# Altium footprint library connectors_USB_ETH.PcbLib: 71 footprints (part 4 of 5)
Each footprint in its own frame and in the unit in brackets; x right, y up, seen from the top. Pads: shape width x height; smd on the part's side, far side on the other; paste and mask are expansions set on the pad; w line width, h text height; cw(c..) or ccw(c..) is an arc to the next point about the centre after c.
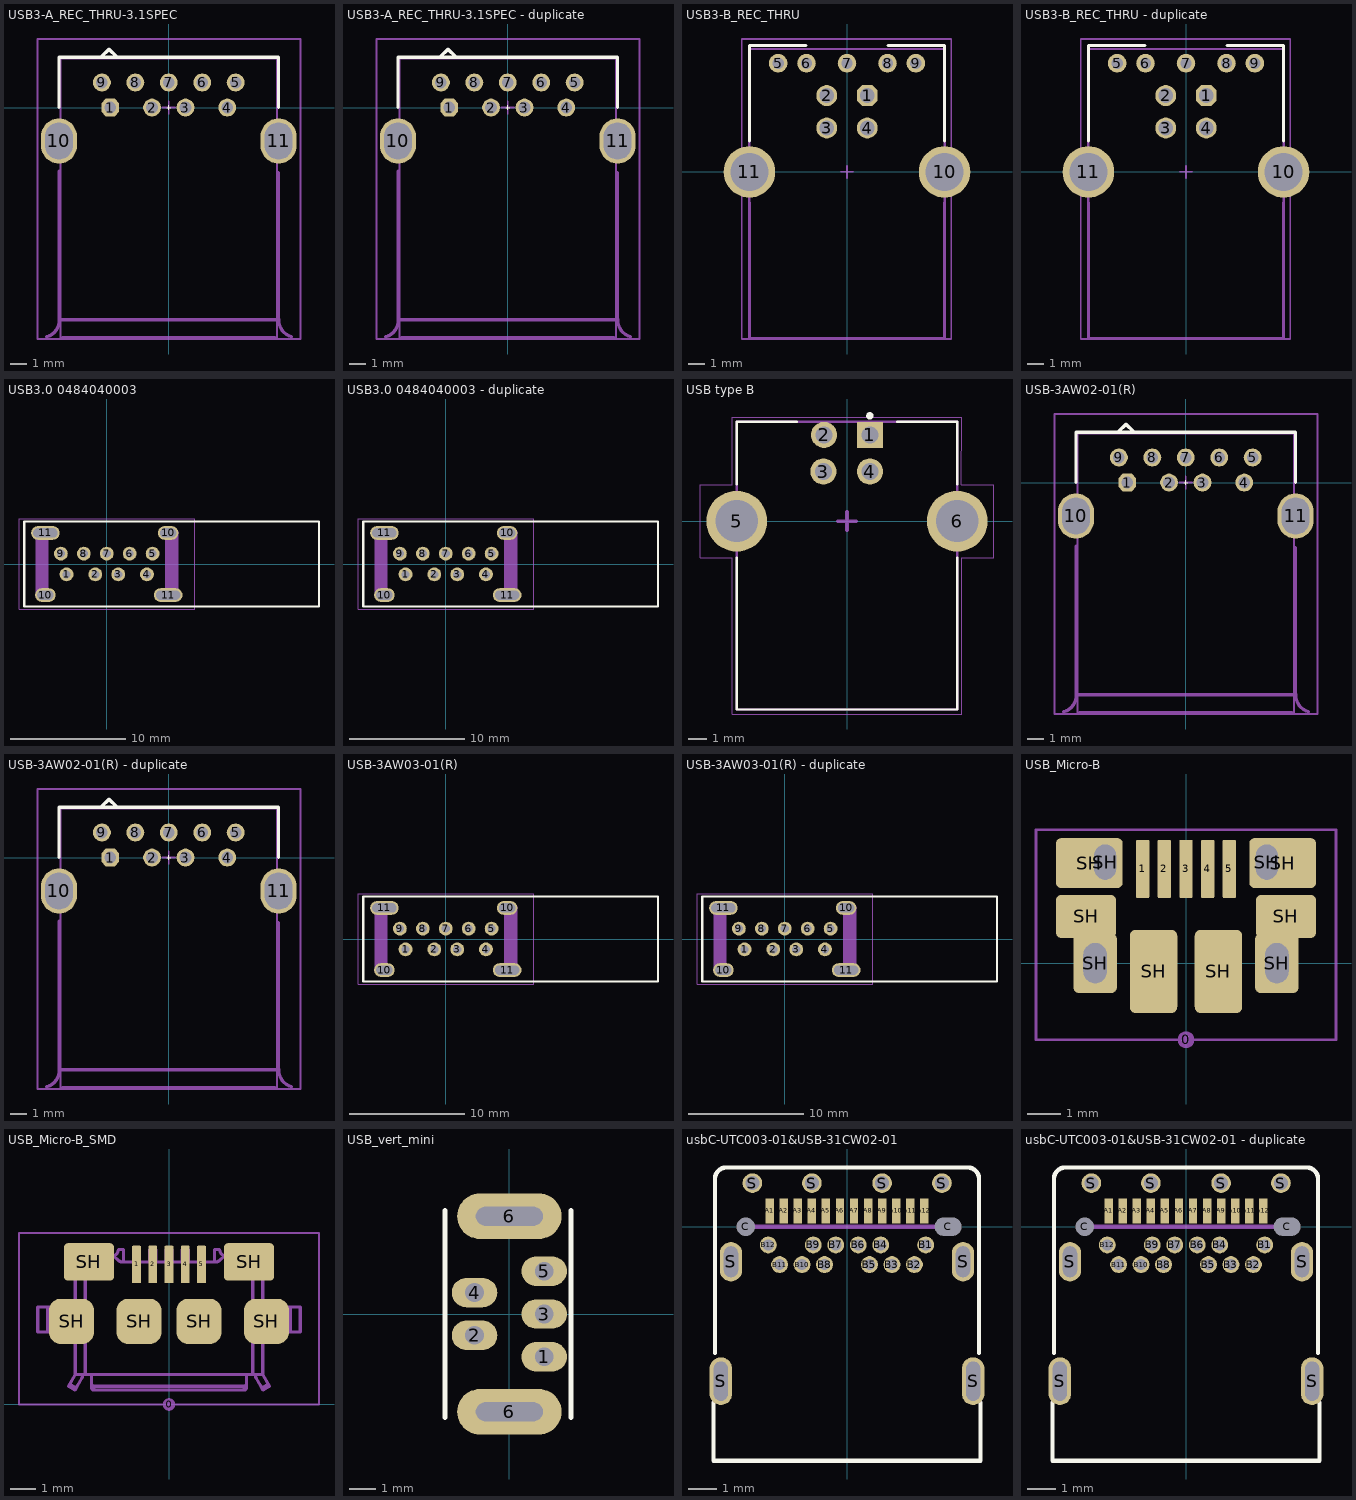
[diagram p3: the footprints below, top view; thin cyan lines are the x and y axes]

## USB3-A_REC_THRU-3.1SPEC [mm] "RECEPTACLE USB3 TYPE A TH 3.1 SPEC SUGGESTED FOOTPRINT AMPHENOL GSB311131HR"
height 7.493
pads (11):
  oct 1.07x1.07 hole 0.7: 1(-3.5,0)
  round 1.07 hole 0.7: 2(-1,0) 3(1,0) 4(3.5,0) 5(4,1.5) 6(2,1.5) 7(0,1.5) 8(-2,1.5) 9(-4,1.5)
  oval 2.159x2.705 hole 1.651 slot 2.197 at 90 deg: 10(-6.57,-2) 11(6.57,-2)
Top Layer:
  rectangle: -7.391,-2.273 -5.74,-1.727
Top Overlay:
  lines w0.025: -0.127,0 0,0 ; 0,-0.127 0,0 ; 0,0.127 0,0 ; 0.127,0 0,0
  lines w0.203: -6.565,0 -6.565,3 6.565,3 6.565,0 ; -4.037,3.037 -3.574,3.5 -3.087,3.013
M11_dimension:
  lines w0.1: -6.477,-13.843 -6.477,2.921 6.477,2.921 6.477,-13.843 -6.477,-13.843
  lines w0.203: -7.304,-13.718 ccw(c-7.589,-12.71) -6.541,-12.677 ; -6.565,-3.8 -6.565,-12.7 6.565,-12.7 6.565,-3.9 ; -6.35,-13.78 6.35,-13.78 ; 6.569,-12.658 ccw(c7.616,-12.691) 7.331,-13.7
  text ".Designator" at -3.725,-3.975 h0.8
  text "1" at -4.5,-0.9 h1.52
Mechanical 13:
  lines w0.1: -6.477,-13.843 -6.477,2.921 6.477,2.921 6.477,-13.843 -6.477,-13.843
Mechanical 15:
  lines w0.1: -0.381,0 0.381,0 ; 0,-0.381 0,0.381 ; -7.85,-13.843 7.875,-13.843 7.875,4.1 -7.85,4.1 -7.85,-13.843
3D body "USB3-A.stp": height 8, standoff -3.22, extent -7.74,-13.777 7.74,2.703

## USB3-A_REC_THRU-3.1SPEC - duplicate [mm] "RECEPTACLE USB3 TYPE A TH 3.1 SPEC SUGGESTED FOOTPRINT AMPHENOL GSB311131HR"
height 7.493
pads (11):
  oct 1.07x1.07 hole 0.7: 1(-3.5,0)
  round 1.07 hole 0.7: 2(-1,0) 3(1,0) 4(3.5,0) 5(4,1.5) 6(2,1.5) 7(0,1.5) 8(-2,1.5) 9(-4,1.5)
  oval 2.159x2.705 hole 1.651 slot 2.197 at 90 deg: 10(-6.57,-2) 11(6.57,-2)
Top Layer:
  rectangle: -7.391,-2.273 -5.74,-1.727
Top Overlay:
  lines w0.025: -0.127,0 0,0 ; 0,-0.127 0,0 ; 0,0.127 0,0 ; 0.127,0 0,0
  lines w0.203: -6.565,0 -6.565,3 6.565,3 6.565,0 ; -4.037,3.037 -3.574,3.5 -3.087,3.013
M11_dimension:
  lines w0.1: -6.477,-13.843 6.477,-13.843 6.477,2.921 -6.477,2.921 -6.477,-13.843
  lines w0.203: -7.304,-13.718 ccw(c-7.589,-12.71) -6.541,-12.677 ; -6.565,-3.8 -6.565,-12.7 6.565,-12.7 6.565,-3.9 ; -6.35,-13.78 6.35,-13.78 ; 6.569,-12.658 ccw(c7.616,-12.691) 7.331,-13.7
  text "1" at -4.5,-0.9 h1.52
  text ".Designator" at -3.725,-3.975 h0.8
Mechanical 13:
  lines w0.1: -6.477,-13.843 6.477,-13.843 6.477,2.921 -6.477,2.921 -6.477,-13.843
Mechanical 15:
  lines w0.1: -0.381,0 0.381,0 ; 0,-0.381 0,0.381 ; -7.85,-13.843 -7.85,4.1 7.875,4.1 7.875,-13.843 -7.85,-13.843
3D body "USB3-A.stp": height 8, standoff -3.22, extent -7.74,-13.777 7.74,2.703

## USB3-B_REC_THRU [mm]
pads (11):
  oct 1.295x1.295 hole 0.914: 1(1.25,4.71)
  round 1.295 hole 0.914: 2(-1.25,4.71) 3(-1.25,2.71) 4(1.25,2.71)
  round 1.15 hole 0.7: 5(-4.25,6.71) 6(-2.5,6.71) 7(0,6.71) 8(2.5,6.71) 9(4.25,6.71)
  round 3.175 hole 2.362: 10(6.02,0) 11(-6.02,0)
Top Overlay:
  lines w0.203: -6.02,1.905 -6.02,7.8 -2.54,7.8 ; 2.54,7.8 6.02,7.8 6.02,1.905
M11_dimension:
  lines w0.1: -6.071,-10.287 6.045,-10.287 6.045,7.569 -6.071,7.569 -6.071,-10.287
Mechanical 13:
  lines w0.1: -5.994,-10.262 6.02,-10.262 6.02,7.595 -5.994,7.595 -5.994,-10.262
Mechanical 15:
  lines w0.1: -0.381,0 0.381,0 ; 0,-0.381 0,0.381 ; -6.502,-10.312 -6.502,8.204 6.426,8.204 6.426,-10.312 -6.502,-10.312
Mechanical 16:
  lines w0.203: -6.02,-1.905 -6.02,-10.28 6.02,-10.28 6.02,-1.905
3D body "USB3-B.stp": height 12.93, standoff -3.2, extent -7.2,-10.324 7.2,7.976

## USB3-B_REC_THRU - duplicate [mm]
pads (11):
  oct 1.295x1.295 hole 0.914: 1(1.25,4.71)
  round 1.295 hole 0.914: 2(-1.25,4.71) 3(-1.25,2.71) 4(1.25,2.71)
  round 1.15 hole 0.7: 5(-4.25,6.71) 6(-2.5,6.71) 7(0,6.71) 8(2.5,6.71) 9(4.25,6.71)
  round 3.175 hole 2.362: 10(6.02,0) 11(-6.02,0)
Top Overlay:
  lines w0.203: -6.02,1.905 -6.02,7.8 -2.54,7.8 ; 2.54,7.8 6.02,7.8 6.02,1.905
M11_dimension:
  lines w0.1: -6.071,-10.287 -6.071,7.569 6.045,7.569 6.045,-10.287 -6.071,-10.287
Mechanical 13:
  lines w0.1: -5.994,-10.262 -5.994,7.595 6.02,7.595 6.02,-10.262 -5.994,-10.262
Mechanical 15:
  lines w0.1: -0.381,0 0.381,0 ; 0,-0.381 0,0.381 ; -6.502,-10.312 6.426,-10.312 6.426,8.204 -6.502,8.204 -6.502,-10.312
Mechanical 16:
  lines w0.203: -6.02,-1.905 -6.02,-10.28 6.02,-10.28 6.02,-1.905
3D body "USB3-B.stp": height 12.93, standoff -3.2, extent -7.2,-10.324 7.2,7.976

## USB3.0 0484040003 [mm] "0484040003"
pads (13):
  round 1.208 hole 0.7: 1(-3.5,-0.9) 2(-1,-0.9) 3(1,-0.9) 4(3.5,-0.9) 5(4,0.9) 6(2,0.9) 7(0,0.9) 8(-2,0.9) 9(-4,0.9)
  oval 1.8x1.2 hole 0.8 slot 1.4 at 0 deg: 10(-5.35,-2.71) 10(5.35,2.71)
  oval 2.5x1.2 hole 0.8 slot 2.1 at 0 deg: 11(-5.35,2.71) 11(5.35,-2.71)
Top Overlay:
  lines w0.2: -7.2,-3.7 -7.2,3.7 18.5,3.7 18.5,-3.7 -7.2,-3.7
M1_3D_TOP:
  region: 6.215,-2.84 5.1,-2.84 5.1,2.847 6.215,2.847
  region: -5.111,-2.84 -6.2,-2.84 -6.2,2.846 -5.111,2.846
  lines w0.05: -7.65,-3.95 7.65,-3.95 7.65,3.95 -7.65,3.95 -7.65,-3.95
3D body "484040003.stp": height 14.6, standoff -3.61, extent -7.15,-3.67 18.55,3.65

## USB3.0 0484040003 - duplicate [mm] "0484040003"
pads (13):
  round 1.208 hole 0.7: 1(-3.5,-0.9) 2(-1,-0.9) 3(1,-0.9) 4(3.5,-0.9) 5(4,0.9) 6(2,0.9) 7(0,0.9) 8(-2,0.9) 9(-4,0.9)
  oval 1.8x1.2 hole 0.8 slot 1.4 at 0 deg: 10(-5.35,-2.71) 10(5.35,2.71)
  oval 2.5x1.2 hole 0.8 slot 2.1 at 0 deg: 11(-5.35,2.71) 11(5.35,-2.71)
Top Overlay:
  lines w0.2: -7.2,-3.7 -7.2,3.7 18.5,3.7 18.5,-3.7 -7.2,-3.7
M1_3D_TOP:
  region: 6.215,-2.84 5.1,-2.84 5.1,2.847 6.215,2.847
  region: -5.111,-2.84 -6.2,-2.84 -6.2,2.846 -5.111,2.846
  lines w0.05: -7.65,-3.95 7.65,-3.95 7.65,3.95 -7.65,3.95 -7.65,-3.95
3D body "484040003.stp": height 14.6, standoff -3.61, extent -7.15,-3.67 18.55,3.65

## USB type B [mm] "TE_292304-5"
pads (6):
  rect 1.428x1.428 hole 0.92: 1(1.25,4.71)
  round 1.428 hole 0.92: 2(-1.25,4.71) 3(-1.29,2.71) 4(1.25,2.71)
  round 3.316 hole 2.3: 5(-6.02,0) 6(6.02,0)
Top Overlay:
  circle w0.2: c1.25,5.75 r0.1
  lines w0.127: -6.02,-2 -6.02,-10.28 6.02,-10.28 6.02,-2 ; -6.02,2 -6.02,5.43 ; -6,5.43 -2.75,5.43 ; 2.75,5.43 6.02,5.43 6.02,2
M3_comm_top:
  text ".comment" at -0.9,-0.3 h1
M5_asm_top:
  lines w0.127: -6.02,-10.28 6.02,-10.28 ; -6.02,-10.28 -6.02,5.43 ; -6.02,-10.28 6.02,-10.28 ; -6.02,-10.28 -6.02,5.43 ; -6.02,5.43 6.02,5.43 ; -6.02,5.43 6.02,5.43 ; 6.02,-10.28 6.02,5.43 ; 6.02,-10.28 6.02,5.43
  text ".Designator" at -1,1.3 h1
M7_courtyard_top:
  lines w0.05: -8,-2 -8,2 -6.27,2 -6.27,5.68 6.27,5.68 6.25,2 8,2 8,-2 6.27,-2 6.27,-10.53 -6.27,-10.53 -6.27,-2 -8,-2
  lines w0.2: -0.5,0 0.5,0 ; 0,-0.5 0,0.5
3D body "c-292304-5-d-3d.stp": height 11.55, standoff -3.87, extent -7.195,-10.25 7.195,5.45

## USB-3AW02-01(R) [mm] "USB-3AW02-01(R)"
height 7.493
pads (11):
  oct 1.07x1.07 hole 0.7: 1(-3.5,0)
  round 1.07 hole 0.7: 2(-1,0) 3(1,0) 4(3.5,0) 5(4,1.5) 6(2,1.5) 7(0,1.5) 8(-2,1.5) 9(-4,1.5)
  oval 2.159x2.705 hole 1.651 slot 2.197 at 90 deg: 10(-6.57,-2) 11(6.57,-2)
Top Layer:
  rectangle: -7.391,-2.273 -5.74,-1.727
Top Overlay:
  lines w0.025: -0.127,0 0,0 ; 0,-0.127 0,0 ; 0,0.127 0,0 ; 0.127,0 0,0
  lines w0.203: -6.565,0 -6.565,3 6.565,3 6.565,0 ; -4.037,3.037 -3.574,3.5 -3.087,3.013
M11_dimension:
  lines w0.1: -6.477,-13.843 -6.477,2.921 6.477,2.921 6.477,-13.843 -6.477,-13.843
  lines w0.203: -7.304,-13.718 ccw(c-7.589,-12.71) -6.541,-12.677 ; -6.565,-3.8 -6.565,-12.7 6.565,-12.7 6.565,-3.9 ; -6.35,-13.78 6.35,-13.78 ; 6.569,-12.658 ccw(c7.616,-12.691) 7.331,-13.7
  text ".Designator" at -3.725,-3.975 h0.8
  text "1" at -4.5,-0.9 h1.52
Mechanical 13:
  lines w0.1: -6.477,-13.843 -6.477,2.921 6.477,2.921 6.477,-13.843 -6.477,-13.843
Mechanical 15:
  lines w0.1: -0.381,0 0.381,0 ; 0,-0.381 0,0.381 ; -7.85,-13.843 7.875,-13.843 7.875,4.1 -7.85,4.1 -7.85,-13.843
3D body "USB3-A.stp": height 8, standoff -3.22, extent -7.74,-13.777 7.74,2.703

## USB-3AW02-01(R) - duplicate [mm] "USB-3AW02-01(R)"
height 7.493
pads (11):
  oct 1.07x1.07 hole 0.7: 1(-3.5,0)
  round 1.07 hole 0.7: 2(-1,0) 3(1,0) 4(3.5,0) 5(4,1.5) 6(2,1.5) 7(0,1.5) 8(-2,1.5) 9(-4,1.5)
  oval 2.159x2.705 hole 1.651 slot 2.197 at 90 deg: 10(-6.57,-2) 11(6.57,-2)
Top Layer:
  rectangle: -7.391,-2.273 -5.74,-1.727
Top Overlay:
  lines w0.025: -0.127,0 0,0 ; 0,-0.127 0,0 ; 0,0.127 0,0 ; 0.127,0 0,0
  lines w0.203: -6.565,0 -6.565,3 6.565,3 6.565,0 ; -4.037,3.037 -3.574,3.5 -3.087,3.013
M11_dimension:
  lines w0.1: -6.477,-13.843 -6.477,2.921 6.477,2.921 6.477,-13.843 -6.477,-13.843
  lines w0.203: -7.304,-13.718 ccw(c-7.589,-12.71) -6.541,-12.677 ; -6.565,-3.8 -6.565,-12.7 6.565,-12.7 6.565,-3.9 ; -6.35,-13.78 6.35,-13.78 ; 6.569,-12.658 ccw(c7.616,-12.691) 7.331,-13.7
  text ".Designator" at -3.725,-3.975 h0.8
  text "1" at -4.5,-0.9 h1.52
Mechanical 13:
  lines w0.1: -6.477,-13.843 -6.477,2.921 6.477,2.921 6.477,-13.843 -6.477,-13.843
Mechanical 15:
  lines w0.1: -0.381,0 0.381,0 ; 0,-0.381 0,0.381 ; -7.85,-13.843 7.875,-13.843 7.875,4.1 -7.85,4.1 -7.85,-13.843
3D body "USB3-A.stp": height 8, standoff -3.22, extent -7.74,-13.777 7.74,2.703

## USB-3AW03-01(R) [mm] "USB-3AW03-01(R)"
pads (13):
  round 1.208 hole 0.7: 1(-3.5,-0.9) 2(-1,-0.9) 3(1,-0.9) 4(3.5,-0.9) 5(4,0.9) 6(2,0.9) 7(0,0.9) 8(-2,0.9) 9(-4,0.9)
  oval 1.8x1.2 hole 0.8 slot 1.4 at 0 deg: 10(-5.35,-2.71) 10(5.35,2.71)
  oval 2.5x1.2 hole 0.8 slot 2.1 at 0 deg: 11(-5.35,2.71) 11(5.35,-2.71)
Top Overlay:
  lines w0.2: -7.2,-3.7 -7.2,3.7 18.5,3.7 18.5,-3.7 -7.2,-3.7
M1_3D_TOP:
  region: 6.215,-2.84 5.1,-2.84 5.1,2.847 6.215,2.847
  region: -5.111,-2.84 -6.2,-2.84 -6.2,2.846 -5.111,2.846
  lines w0.05: -7.65,-3.95 7.65,-3.95 7.65,3.95 -7.65,3.95 -7.65,-3.95
3D body "usb3_a-usb3_a-e.stp": height 14.7, standoff -3.51, extent -7.2,-3.66 18.5,3.66

## USB-3AW03-01(R) - duplicate [mm] "USB-3AW03-01(R)"
pads (13):
  round 1.208 hole 0.7: 1(-3.5,-0.9) 2(-1,-0.9) 3(1,-0.9) 4(3.5,-0.9) 5(4,0.9) 6(2,0.9) 7(0,0.9) 8(-2,0.9) 9(-4,0.9)
  oval 1.8x1.2 hole 0.8 slot 1.4 at 0 deg: 10(-5.35,-2.71) 10(5.35,2.71)
  oval 2.5x1.2 hole 0.8 slot 2.1 at 0 deg: 11(-5.35,2.71) 11(5.35,-2.71)
Top Overlay:
  lines w0.2: -7.2,-3.7 -7.2,3.7 18.5,3.7 18.5,-3.7 -7.2,-3.7
M1_3D_TOP:
  region: 6.215,-2.84 5.1,-2.84 5.1,2.847 6.215,2.847
  region: -5.111,-2.84 -6.2,-2.84 -6.2,2.846 -5.111,2.846
  lines w0.05: -7.65,-3.95 7.65,-3.95 7.65,3.95 -7.65,3.95 -7.65,-3.95
3D body "usb3_a-usb3_a-e.stp": height 14.7, standoff -3.51, extent -7.2,-3.66 18.5,3.66

## USB_Micro-B [mm] "10103594-0001LF"
height 2.286
pads (16):
  round 0.508 on Mech15: 0(0,-2.3)
  rrect20% 0.4x1.75 smd: 1(-1.3,2.825) 2(-0.65,2.825) 3(0,2.825) 4(0.65,2.825) 5(1.3,2.825)
  rrect25% 1.8x1.3 smd: SH(-3,1.4) SH(3,1.4)
  rrect20% 2x1.5 smd: SH(-2.9,3) SH(2.9,3)
  rrect25% 1.3x1.8 hole 0.7 slot 1.2 at 90 deg: SH(-2.725,0) SH(2.725,0)
  rrect50% 1.05x1.46 hole 0.65 slot 1.05 at 90 deg: SH(-2.425,3.03) SH(2.425,3.03)
  rrect25% 1.425x2.5 smd: SH(-0.975,-0.25) SH(0.975,-0.25)
Mechanical 15:
  lines w0.076: -4.5,-2.3 -4.5,4 4.5,4 4.5,-2.3 -4.5,-2.3
3D body "10103594.STEP": height 2.9, standoff -0.7, extent -4.02,-2.849 4.02,3.184

## USB_Micro-B_SMD [mm]
height 2.286
pads (12):
  round 0.508 on Mech15: 0(0,0)
  rrect20% 0.35x1.5 smd: 1(-1.3,5.6) 2(-0.65,5.6) 3(0,5.6) 4(0.65,5.6) 5(1.3,5.6)
  rrect50% 1.8x1.8 smd: SH(-3.9,3.325) SH(-1.2,3.325) SH(1.2,3.325) SH(3.9,3.325)
  rrect20% 2x1.5 smd: SH(-3.2,5.7) SH(3.2,5.7)
Top Solder:
  region: 1.905,4.826 1.905,6.35 -1.905,6.35 -1.905,4.826
Mechanical 13:
  lines w0.127: -4.85,2.9 -4.85,3.9 ; -3.97,0.819 -3.71,0.669 ; -3.85,2.9 -3.85,3.9 ; -3.75,2.9 -5.25,2.9 -5.25,3.9 -3.75,3.9 ; -3.45,1.2 cw(c-3.75,1.199) -3.49,1.049 -3.76,0.582 -4.02,0.732 -3.75,1.2 ; -3.35,1.2 -3.35,6.2 ; -3.1,0.819 ccw(c-3.006,0.826) -3,0.732 ; -2.526,6.193 -2.526,6.2 ; -2.229,5.953 ccw(c-2.275,6.2) -2.024,6.2 -1.825,6.2 -1.825,5.7 ; -1.425,5.7 -1.425,6.2 -1.175,6.2 -1.175,5.7 ; -0.775,5.7 -0.775,6.2 -0.525,6.2 -0.525,5.7 ; -0.125,5.7 -0.125,6.2 0.125,6.2 0.125,5.7 ; 0.525,5.7 0.525,6.2 0.775,6.2 0.775,5.7 ; 1.175,5.7 1.175,6.2 1.425,6.2 1.425,5.7 ; 1.825,5.7 1.825,6.2 2.024,6.2 ccw(c2.275,6.2) 2.229,5.953 ; 2.526,6.193 2.526,6.2 ; 3.1,0.819 cw(c3.006,0.826) 3,0.732 ; 3.1,1.199 -3.1,1.2 ; 3.35,1.2 3.35,6.2 ; 3.45,1.2 ccw(c3.75,1.199) 3.49,1.049 3.76,0.582 4.02,0.732 3.75,1.2 ; 3.71,0.669 3.97,0.819 ; 3.75,2.9 5.25,2.9 5.25,3.9 3.75,3.9 ; 3.85,2.9 3.85,3.9 ; 4.85,2.9 4.85,3.9 ; -3.75,1.2 -3.1,1.2 ; -3.75,1.2 -3.75,6.2 -2.577,6.2 cw(c-2.577,6) -2.443,6.148 -2.007,5.752 ccw(c-1.873,5.9) -1.873,5.7 1.873,5.7 ccw(c1.873,5.9) 2.007,5.752 2.443,6.148 cw(c2.577,6) 2.577,6.2 3.75,6.2 3.75,1.2 ; -3.1,1.2 -3.1,0.669 ccw(c-3.006,0.676) -3,0.582 ; -3,0.582 -3,0.732 ; -3,0.582 3,0.582 ; -3,0.732 3,0.732 ; 3,0.582 ccw(c3.006,0.676) 3.1,0.669 3.1,1.2 3.75,1.2 ; 3,0.582 3,0.732
Mechanical 15:
  lines w0.076: -6,0 6,0 6,6.858 -6,6.858 -6,0
3D body "10104111.step": height 2.82, standoff -0.26, extent -4.4,0.584 4.4,6.209

## USB_vert_mini [mm] "miniUSB"
pads (7):
  oval 1.7x1.1 hole 0.7: 1(1.3,-1.6) 2(-1.3,-0.795) 3(1.3,0) 4(-1.3,0.8) 5(1.3,1.6)
  oval 3.9x1.7 hole 0.7 slot 2.5 at 0 deg: 6(0,-3.65) 6(0,3.65)
Top Overlay:
  lines w0.2: -2.4,-3.85 -2.4,3.85 ; 2.3,-3.85 2.3,3.85
3D body "5000751517.stp": height 7.75, standoff -2.05, extent -2.4,-3.85 2.3,3.85

## usbC-UTC003-01&USB-31CW02-01 [mm]
height 1.2
pads (34):
  rect 0.3x0.9 smd: A1(-2.75,0.56) A2(-2.25,0.56) A3(-1.75,0.56) A4(-1.25,0.56) A5(-0.75,0.56) A6(-0.25,0.56) A7(0.25,0.56) A8(0.75,0.56) A9(1.25,0.56) A10(1.75,0.56) A11(2.25,0.56) A12(2.75,0.56)
  round 0.6 hole 0.4: B1(2.8,-0.65) B2(2.4,-1.35) B3(1.6,-1.35) B4(1.2,-0.65) B5(0.8,-1.35) B6(0.4,-0.65) B7(-0.4,-0.65) B8(-0.8,-1.35) B9(-1.2,-0.65) B10(-1.6,-1.35) B11(-2.4,-1.35) B12(-2.8,-0.65)
  round 0.5 hole 0.65 unplated: C(-3.6,0)
  round 0.5 hole 0.65 slot 0.95 at 0 deg unplated: C(3.6,0)
  oval 0.8x1.7 hole 0.5 slot 1.4 at 90 deg: S(-4.49,-5.5) S(4.49,-5.5)
  oval 0.8x1.4 hole 0.5 slot 1.1 at 90 deg: S(-4.13,-1.25) S(4.13,-1.25)
  round 0.7 hole 0.5: S(-3.37,1.55) S(-1.25,1.55) S(1.25,1.55) S(3.38,1.55)
Top Overlay:
  lines w0.15: -4.75,-6.25 -4.75,-8.335 4.75,-8.335 4.75,-6.25 ; -4.7,-4.5 -4.7,0.61 -4.7,1.71 -4.7,1.714 cw(c-4.352,1.71) -4.699,1.729 cw(c-4.349,1.71) -4.699,1.742 cw(c-4.345,1.709) -4.697,1.753 cw(c-4.341,1.709) -4.696,1.764 cw(c-4.338,1.708) -4.694,1.773 cw(c-4.334,1.708) -4.692,1.783 cw(c-4.33,1.707) -4.69,1.792 cw(c-4.327,1.706) -4.688,1.801 cw(c-4.323,1.705) -4.686,1.81 cw(c-4.319,1.704) -4.683,1.819 cw(c-4.315,1.703) -4.68,1.828 cw(c-4.311,1.701) -4.677,1.837 cw(c-4.308,1.7) -4.673,1.845 cw(c-4.304,1.699) -4.67,1.854 cw(c-4.3,1.697) -4.666,1.863 cw(c-4.296,1.695) -4.662,1.872 cw(c-4.293,1.693) -4.657,1.882 cw(c-4.289,1.691) -4.652,1.891 cw(c-4.285,1.689) -4.646,1.902 cw(c-4.281,1.687) -4.639,1.913 cw(c-4.278,1.685) -4.631,1.925 cw(c-4.274,1.682) -4.621,1.939 cw(c-4.267,1.677) -4.547,2.017 cw(c-4.27,1.68) -4.529,2.031 cw(c-4.272,1.684) -4.514,2.041 cw(c-4.275,1.688) -4.502,2.049 cw(c-4.277,1.691) -4.491,2.056 cw(c-4.28,1.695) -4.481,2.062 cw(c-4.282,1.699) -4.471,2.067 cw(c-4.284,1.703) -4.462,2.072 cw(c-4.285,1.707) -4.453,2.076 cw(c-4.287,1.71) -4.443,2.08 cw(c-4.289,1.714) -4.435,2.084 cw(c-4.29,1.718) -4.426,2.087 cw(c-4.292,1.722) -4.417,2.09 cw(c-4.293,1.726) -4.408,2.093 cw(c-4.294,1.729) -4.4,2.096 cw(c-4.295,1.733) -4.391,2.098 cw(c-4.296,1.737) -4.382,2.1 cw(c-4.297,1.741) -4.372,2.102 cw(c-4.298,1.744) -4.363,2.104 cw(c-4.299,1.748) -4.352,2.106 cw(c-4.299,1.752) -4.341,2.108 cw(c-4.3,1.756) -4.329,2.109 cw(c-4.3,1.759) -4.316,2.11 cw(c-4.3,1.763) -4.3,2.11 4.3,2.11 4.304,2.11 cw(c4.3,1.762) 4.319,2.109 cw(c4.3,1.759) 4.332,2.109 cw(c4.299,1.755) 4.343,2.107 cw(c4.299,1.751) 4.354,2.106 cw(c4.298,1.748) 4.363,2.104 cw(c4.298,1.744) 4.373,2.102 cw(c4.297,1.74) 4.382,2.1 cw(c4.296,1.737) 4.391,2.098 cw(c4.295,1.733) 4.4,2.096 cw(c4.294,1.729) 4.409,2.093 cw(c4.293,1.725) 4.418,2.09 cw(c4.291,1.721) 4.427,2.087 cw(c4.29,1.718) 4.435,2.083 cw(c4.289,1.714) 4.444,2.08 cw(c4.287,1.71) 4.453,2.076 cw(c4.285,1.706) 4.462,2.072 cw(c4.283,1.703) 4.472,2.067 cw(c4.281,1.699) 4.481,2.062 cw(c4.279,1.695) 4.492,2.056 cw(c4.277,1.691) 4.503,2.049 cw(c4.275,1.688) 4.515,2.041 cw(c4.272,1.684) 4.529,2.031 cw(c4.267,1.677) 4.607,1.957 cw(c4.27,1.68) 4.621,1.939 cw(c4.274,1.682) 4.631,1.924 cw(c4.278,1.685) 4.639,1.912 cw(c4.281,1.687) 4.646,1.901 cw(c4.285,1.689) 4.652,1.891 cw(c4.289,1.692) 4.657,1.881 cw(c4.293,1.694) 4.662,1.872 cw(c4.297,1.695) 4.666,1.863 cw(c4.3,1.697) 4.67,1.853 cw(c4.304,1.699) 4.674,1.845 cw(c4.308,1.7) 4.677,1.836 cw(c4.312,1.702) 4.68,1.827 cw(c4.316,1.703) 4.683,1.818 cw(c4.319,1.704) 4.686,1.81 cw(c4.323,1.705) 4.688,1.801 cw(c4.327,1.706) 4.69,1.792 cw(c4.331,1.707) 4.692,1.782 cw(c4.334,1.708) 4.694,1.773 cw(c4.338,1.708) 4.696,1.762 cw(c4.342,1.709) 4.698,1.751 cw(c4.346,1.71) 4.699,1.739 cw(c4.349,1.71) 4.7,1.726 cw(c4.353,1.71) 4.7,1.71 4.7,0.61 4.7,-4.5
Mechanical 13:
  lines w0.15: -3.6,0 3.6,0
3D body "utc003-01_2.STEP": height 3.08, standoff -1.16, extent -4.61,-8.335 4.61,1.725

## usbC-UTC003-01&USB-31CW02-01 - duplicate [mm]
height 1.2
pads (34):
  rect 0.3x0.9 smd: A1(-2.75,0.56) A2(-2.25,0.56) A3(-1.75,0.56) A4(-1.25,0.56) A5(-0.75,0.56) A6(-0.25,0.56) A7(0.25,0.56) A8(0.75,0.56) A9(1.25,0.56) A10(1.75,0.56) A11(2.25,0.56) A12(2.75,0.56)
  round 0.6 hole 0.4: B1(2.8,-0.65) B2(2.4,-1.35) B3(1.6,-1.35) B4(1.2,-0.65) B5(0.8,-1.35) B6(0.4,-0.65) B7(-0.4,-0.65) B8(-0.8,-1.35) B9(-1.2,-0.65) B10(-1.6,-1.35) B11(-2.4,-1.35) B12(-2.8,-0.65)
  round 0.5 hole 0.65 unplated: C(-3.6,0)
  round 0.5 hole 0.65 slot 0.95 at 0 deg unplated: C(3.6,0)
  oval 0.8x1.7 hole 0.5 slot 1.4 at 90 deg: S(-4.49,-5.5) S(4.49,-5.5)
  oval 0.8x1.4 hole 0.5 slot 1.1 at 90 deg: S(-4.13,-1.25) S(4.13,-1.25)
  round 0.7 hole 0.5: S(-3.37,1.55) S(-1.25,1.55) S(1.25,1.55) S(3.38,1.55)
Top Overlay:
  lines w0.15: -4.75,-6.25 -4.75,-8.335 4.75,-8.335 4.75,-6.25 ; -4.7,-4.5 -4.7,0.61 -4.7,1.71 -4.7,1.714 cw(c-4.352,1.71) -4.699,1.729 cw(c-4.349,1.71) -4.699,1.742 cw(c-4.345,1.709) -4.697,1.753 cw(c-4.341,1.709) -4.696,1.764 cw(c-4.338,1.708) -4.694,1.773 cw(c-4.334,1.708) -4.692,1.783 cw(c-4.33,1.707) -4.69,1.792 cw(c-4.327,1.706) -4.688,1.801 cw(c-4.323,1.705) -4.686,1.81 cw(c-4.319,1.704) -4.683,1.819 cw(c-4.315,1.703) -4.68,1.828 cw(c-4.311,1.701) -4.677,1.837 cw(c-4.308,1.7) -4.673,1.845 cw(c-4.304,1.699) -4.67,1.854 cw(c-4.3,1.697) -4.666,1.863 cw(c-4.296,1.695) -4.662,1.872 cw(c-4.293,1.693) -4.657,1.882 cw(c-4.289,1.691) -4.652,1.891 cw(c-4.285,1.689) -4.646,1.902 cw(c-4.281,1.687) -4.639,1.913 cw(c-4.278,1.685) -4.631,1.925 cw(c-4.274,1.682) -4.621,1.939 cw(c-4.267,1.677) -4.547,2.017 cw(c-4.27,1.68) -4.529,2.031 cw(c-4.272,1.684) -4.514,2.041 cw(c-4.275,1.688) -4.502,2.049 cw(c-4.277,1.691) -4.491,2.056 cw(c-4.28,1.695) -4.481,2.062 cw(c-4.282,1.699) -4.471,2.067 cw(c-4.284,1.703) -4.462,2.072 cw(c-4.285,1.707) -4.453,2.076 cw(c-4.287,1.71) -4.443,2.08 cw(c-4.289,1.714) -4.435,2.084 cw(c-4.29,1.718) -4.426,2.087 cw(c-4.292,1.722) -4.417,2.09 cw(c-4.293,1.726) -4.408,2.093 cw(c-4.294,1.729) -4.4,2.096 cw(c-4.295,1.733) -4.391,2.098 cw(c-4.296,1.737) -4.382,2.1 cw(c-4.297,1.741) -4.372,2.102 cw(c-4.298,1.744) -4.363,2.104 cw(c-4.299,1.748) -4.352,2.106 cw(c-4.299,1.752) -4.341,2.108 cw(c-4.3,1.756) -4.329,2.109 cw(c-4.3,1.759) -4.316,2.11 cw(c-4.3,1.763) -4.3,2.11 4.3,2.11 4.304,2.11 cw(c4.3,1.762) 4.319,2.109 cw(c4.3,1.759) 4.332,2.109 cw(c4.299,1.755) 4.343,2.107 cw(c4.299,1.751) 4.354,2.106 cw(c4.298,1.748) 4.363,2.104 cw(c4.298,1.744) 4.373,2.102 cw(c4.297,1.74) 4.382,2.1 cw(c4.296,1.737) 4.391,2.098 cw(c4.295,1.733) 4.4,2.096 cw(c4.294,1.729) 4.409,2.093 cw(c4.293,1.725) 4.418,2.09 cw(c4.291,1.721) 4.427,2.087 cw(c4.29,1.718) 4.435,2.083 cw(c4.289,1.714) 4.444,2.08 cw(c4.287,1.71) 4.453,2.076 cw(c4.285,1.706) 4.462,2.072 cw(c4.283,1.703) 4.472,2.067 cw(c4.281,1.699) 4.481,2.062 cw(c4.279,1.695) 4.492,2.056 cw(c4.277,1.691) 4.503,2.049 cw(c4.275,1.688) 4.515,2.041 cw(c4.272,1.684) 4.529,2.031 cw(c4.267,1.677) 4.607,1.957 cw(c4.27,1.68) 4.621,1.939 cw(c4.274,1.682) 4.631,1.924 cw(c4.278,1.685) 4.639,1.912 cw(c4.281,1.687) 4.646,1.901 cw(c4.285,1.689) 4.652,1.891 cw(c4.289,1.692) 4.657,1.881 cw(c4.293,1.694) 4.662,1.872 cw(c4.297,1.695) 4.666,1.863 cw(c4.3,1.697) 4.67,1.853 cw(c4.304,1.699) 4.674,1.845 cw(c4.308,1.7) 4.677,1.836 cw(c4.312,1.702) 4.68,1.827 cw(c4.316,1.703) 4.683,1.818 cw(c4.319,1.704) 4.686,1.81 cw(c4.323,1.705) 4.688,1.801 cw(c4.327,1.706) 4.69,1.792 cw(c4.331,1.707) 4.692,1.782 cw(c4.334,1.708) 4.694,1.773 cw(c4.338,1.708) 4.696,1.762 cw(c4.342,1.709) 4.698,1.751 cw(c4.346,1.71) 4.699,1.739 cw(c4.349,1.71) 4.7,1.726 cw(c4.353,1.71) 4.7,1.71 4.7,0.61 4.7,-4.5
Mechanical 13:
  lines w0.15: -3.6,0 3.6,0
3D body "utc003-01_2.STEP": height 3.08, standoff -1.16, extent -4.61,-8.335 4.61,1.725